# Altium schematic symbol library jlcpcb_2025_04_capacitors_extended_1206.schlib: 2503 symbols (part 14 of 14) (continued)
## TCC1206X7R334K500DT
designator C?  Capacitance: 330nF  (hidden comment: *)
Capacitor, Ceramic (MLCC), 330nF, ±10%, 50V, X7R, ±10%, SMD 1206; Manufacturer: CCTC; Manufacturer Part Number: TCC1206X7R334K500DT; Package Size: 1206; JLCPCB Basic Part: No; JLCPCB Part Number: C282862; Supplier 1: LCSC; Category: Capacitors - MLCC; Supplier Part Number 1: C282862; Tolerance: ±10%; Voltage Rating: 50V; Temperature Coefficient: X7R; RoHS: Yes; ComponentLink1Description: Datasheet; ComponentLink1URL: https://wmsc.lcsc.com/wmsc/upload/file/pdf/v2/lcsc/2304140030_CCTC-TCC1206X7R334K500DT_C282862.pdf; ComponentLink2Description: JLCPCB Part URL; ComponentLink2URL: https://jlcpcb.com/partdetail/C282862; ComponentLink3Description: LCSC Part URL; ComponentLink3URL: https://lcsc.com/product-detail/Multilayer-Ceramic-Capacitors-MLCC---SMD-SMT_CCTC-CCTC-TCC1206X7R334K500DT_C282862.html
footprint CAP-1206 (1206 (3216M) Capacitor)
pins: 1, 2

## TCC1206X7R335K250FT
designator C?  Capacitance: 3.3uF  (hidden comment: *)
Capacitor, Ceramic (MLCC), 3.3uF, ±10%, 25V, X7R, ±10%, SMD 1206; Manufacturer: CCTC; Manufacturer Part Number: TCC1206X7R335K250FT; Package Size: 1206; JLCPCB Basic Part: No; JLCPCB Part Number: C394259; Supplier 1: LCSC; Category: Capacitors - MLCC; Supplier Part Number 1: C394259; Tolerance: ±10%; Voltage Rating: 25V; Temperature Coefficient: X7R; RoHS: Yes; ComponentLink1Description: Datasheet; ComponentLink1URL: https://wmsc.lcsc.com/wmsc/upload/file/pdf/v2/lcsc/2304140030_CCTC-TCC1206X7R335K250FT_C394259.pdf; ComponentLink2Description: JLCPCB Part URL; ComponentLink2URL: https://jlcpcb.com/partdetail/C394259; ComponentLink3Description: LCSC Part URL; ComponentLink3URL: https://lcsc.com/product-detail/Multilayer-Ceramic-Capacitors-MLCC---SMD-SMT_CCTC-CCTC-TCC1206X7R335K250FT_C394259.html
footprint CAP-1206 (1206 (3216M) Capacitor)
pins: 1, 2

## TCC1206X7R391K102DTS
designator C?  Capacitance: 390pF  (hidden comment: *)
Capacitor, Ceramic (MLCC), 390pF, ±10%, 1kV, X7R, ±10%, SMD 1206; Manufacturer: CCTC; Manufacturer Part Number: TCC1206X7R391K102DTS; Package Size: 1206; JLCPCB Basic Part: No; JLCPCB Part Number: C696869; Supplier 1: LCSC; Category: Capacitors - MLCC; Supplier Part Number 1: C696869; Tolerance: ±10%; Voltage Rating: 1kV; Temperature Coefficient: X7R; RoHS: Yes; ComponentLink1Description: Datasheet; ComponentLink1URL: https://wmsc.lcsc.com/wmsc/upload/file/pdf/v2/lcsc/2304140030_CCTC-TCC1206X7R391K102DTS_C696869.pdf; ComponentLink2Description: JLCPCB Part URL; ComponentLink2URL: https://jlcpcb.com/partdetail/C696869; ComponentLink3Description: LCSC Part URL; ComponentLink3URL: https://lcsc.com/product-detail/Multilayer-Ceramic-Capacitors-MLCC---SMD-SMT_CCTC-CCTC-TCC1206X7R391K102DTS_C696869.html
footprint CAP-1206 (1206 (3216M) Capacitor)
pins: 1, 2

## TCC1206X7R391K500DT
designator C?  Capacitance: 390pF  (hidden comment: *)
Capacitor, Ceramic (MLCC), 390pF, ±10%, 50V, X7R, ±10%, SMD 1206; Manufacturer: CCTC; Manufacturer Part Number: TCC1206X7R391K500DT; Package Size: 1206; JLCPCB Basic Part: No; JLCPCB Part Number: C377097; Supplier 1: LCSC; Category: Capacitors - MLCC; Supplier Part Number 1: C377097; Tolerance: ±10%; Voltage Rating: 50V; Temperature Coefficient: X7R; RoHS: Yes; ComponentLink1Description: Datasheet; ComponentLink1URL: https://wmsc.lcsc.com/wmsc/upload/file/pdf/v2/lcsc/2304140030_CCTC-TCC1206X7R391K500DT_C377097.pdf; ComponentLink2Description: JLCPCB Part URL; ComponentLink2URL: https://jlcpcb.com/partdetail/C377097; ComponentLink3Description: LCSC Part URL; ComponentLink3URL: https://lcsc.com/product-detail/Multilayer-Ceramic-Capacitors-MLCC---SMD-SMT_CCTC-CCTC-TCC1206X7R391K500DT_C377097.html
footprint CAP-1206 (1206 (3216M) Capacitor)
pins: 1, 2

## TCC1206X7R392K102FT
designator C?  Capacitance: 3.9nF  (hidden comment: *)
Capacitor, Ceramic (MLCC), 3.9nF, ±10%, 1kV, X7R, ±10%, SMD 1206; Manufacturer: CCTC; Manufacturer Part Number: TCC1206X7R392K102FT; Package Size: 1206; JLCPCB Basic Part: No; JLCPCB Part Number: C7393995; Supplier 1: LCSC; Category: Capacitors - MLCC; Supplier Part Number 1: C7393995; Tolerance: ±10%; Voltage Rating: 1kV; Temperature Coefficient: X7R; RoHS: Yes; ComponentLink1Description: Datasheet; ComponentLink1URL: https://wmsc.lcsc.com/wmsc/upload/file/pdf/v2/lcsc/2306211528_CCTC-TCC1206X7R392K102FT_C7393995.pdf; ComponentLink2Description: JLCPCB Part URL; ComponentLink2URL: https://jlcpcb.com/partdetail/C7393995; ComponentLink3Description: LCSC Part URL; ComponentLink3URL: https://lcsc.com/product-detail/Multilayer-Ceramic-Capacitors-MLCC---SMD-SMT_CCTC-CCTC-TCC1206X7R392K102FT_C7393995.html
footprint CAP-1206 (1206 (3216M) Capacitor)
pins: 1, 2

## TCC1206X7R392K500DT
designator C?  Capacitance: 3.9nF  (hidden comment: *)
Capacitor, Ceramic (MLCC), 3.9nF, ±10%, 50V, X7R, ±10%, SMD 1206; Manufacturer: CCTC; Manufacturer Part Number: TCC1206X7R392K500DT; Package Size: 1206; JLCPCB Basic Part: No; JLCPCB Part Number: C696867; Supplier 1: LCSC; Category: Capacitors - MLCC; Supplier Part Number 1: C696867; Tolerance: ±10%; Voltage Rating: 50V; Temperature Coefficient: X7R; RoHS: Yes; ComponentLink1Description: Datasheet; ComponentLink1URL: https://wmsc.lcsc.com/wmsc/upload/file/pdf/v2/lcsc/2304140030_CCTC-TCC1206X7R392K500DT_C696867.pdf; ComponentLink2Description: JLCPCB Part URL; ComponentLink2URL: https://jlcpcb.com/partdetail/C696867; ComponentLink3Description: LCSC Part URL; ComponentLink3URL: https://lcsc.com/product-detail/Multilayer-Ceramic-Capacitors-MLCC---SMD-SMT_CCTC-CCTC-TCC1206X7R392K500DT_C696867.html
footprint CAP-1206 (1206 (3216M) Capacitor)
pins: 1, 2

## TCC1206X7R393K500DT
designator C?  Capacitance: 39nF  (hidden comment: *)
Capacitor, Ceramic (MLCC), 39nF, ±10%, 50V, X7R, ±10%, SMD 1206; Manufacturer: CCTC; Manufacturer Part Number: TCC1206X7R393K500DT; Package Size: 1206; JLCPCB Basic Part: No; JLCPCB Part Number: C282863; Supplier 1: LCSC; Category: Capacitors - MLCC; Supplier Part Number 1: C282863; Tolerance: ±10%; Voltage Rating: 50V; Temperature Coefficient: X7R; RoHS: Yes; ComponentLink1Description: Datasheet; ComponentLink1URL: https://wmsc.lcsc.com/wmsc/upload/file/pdf/v2/lcsc/2304140030_CCTC-TCC1206X7R393K500DT_C282863.pdf; ComponentLink2Description: JLCPCB Part URL; ComponentLink2URL: https://jlcpcb.com/partdetail/C282863; ComponentLink3Description: LCSC Part URL; ComponentLink3URL: https://lcsc.com/product-detail/Multilayer-Ceramic-Capacitors-MLCC---SMD-SMT_CCTC-CCTC-TCC1206X7R393K500DT_C282863.html
footprint CAP-1206 (1206 (3216M) Capacitor)
pins: 1, 2

## TCC1206X7R471K102DTS
designator C?  Capacitance: 470pF  (hidden comment: *)
Capacitor, Ceramic (MLCC), 470pF, ±10%, 1kV, X7R, ±10%, SMD 1206; Manufacturer: CCTC; Manufacturer Part Number: TCC1206X7R471K102DTS; Package Size: 1206; JLCPCB Basic Part: No; JLCPCB Part Number: C377098; Supplier 1: LCSC; Category: Capacitors - MLCC; Supplier Part Number 1: C377098; Tolerance: ±10%; Voltage Rating: 1kV; Temperature Coefficient: X7R; RoHS: Yes; ComponentLink1Description: Datasheet; ComponentLink1URL: https://wmsc.lcsc.com/wmsc/upload/file/pdf/v2/lcsc/2304140030_CCTC-TCC1206X7R471K102DTS_C377098.pdf; ComponentLink2Description: JLCPCB Part URL; ComponentLink2URL: https://jlcpcb.com/partdetail/C377098; ComponentLink3Description: LCSC Part URL; ComponentLink3URL: https://lcsc.com/product-detail/Multilayer-Ceramic-Capacitors-MLCC---SMD-SMT_CCTC-CCTC-TCC1206X7R471K102DTS_C377098.html
footprint CAP-1206 (1206 (3216M) Capacitor)
pins: 1, 2

## TCC1206X7R471K102FT
designator C?  Capacitance: 470pF  (hidden comment: *)
Capacitor, Ceramic (MLCC), 470pF, ±10%, 1kV, X7R, ±10%, SMD 1206; Manufacturer: CCTC; Manufacturer Part Number: TCC1206X7R471K102FT; Package Size: 1206; JLCPCB Basic Part: No; JLCPCB Part Number: C282864; Supplier 1: LCSC; Category: Capacitors - MLCC; Supplier Part Number 1: C282864; Tolerance: ±10%; Voltage Rating: 1kV; Temperature Coefficient: X7R; RoHS: Yes; ComponentLink1Description: Datasheet; ComponentLink1URL: https://wmsc.lcsc.com/wmsc/upload/file/pdf/v2/lcsc/2304140030_CCTC-TCC1206X7R471K102FT_C282864.pdf; ComponentLink2Description: JLCPCB Part URL; ComponentLink2URL: https://jlcpcb.com/partdetail/C282864; ComponentLink3Description: LCSC Part URL; ComponentLink3URL: https://lcsc.com/product-detail/Multilayer-Ceramic-Capacitors-MLCC---SMD-SMT_CCTC-CCTC-TCC1206X7R471K102FT_C282864.html
footprint CAP-1206 (1206 (3216M) Capacitor)
pins: 1, 2

## TCC1206X7R471K202FT
designator C?  Capacitance: 470pF  (hidden comment: *)
Capacitor, Ceramic (MLCC), 470pF, ±10%, 2kV, X7R, ±10%, SMD 1206; Manufacturer: CCTC; Manufacturer Part Number: TCC1206X7R471K202FT; Package Size: 1206; JLCPCB Basic Part: No; JLCPCB Part Number: C359188; Supplier 1: LCSC; Category: Capacitors - MLCC; Supplier Part Number 1: C359188; Tolerance: ±10%; Voltage Rating: 2kV; Temperature Coefficient: X7R; RoHS: Yes; ComponentLink1Description: Datasheet; ComponentLink1URL: https://wmsc.lcsc.com/wmsc/upload/file/pdf/v2/lcsc/2304140030_CCTC-TCC1206X7R471K202FT_C359188.pdf; ComponentLink2Description: JLCPCB Part URL; ComponentLink2URL: https://jlcpcb.com/partdetail/C359188; ComponentLink3Description: LCSC Part URL; ComponentLink3URL: https://lcsc.com/product-detail/Multilayer-Ceramic-Capacitors-MLCC---SMD-SMT_CCTC-CCTC-TCC1206X7R471K202FT_C359188.html
footprint CAP-1206 (1206 (3216M) Capacitor)
pins: 1, 2

## TCC1206X7R471K251DT
designator C?  Capacitance: 470pF  (hidden comment: *)
Capacitor, Ceramic (MLCC), 470pF, ±10%, 250V, X7R, ±10%, SMD 1206; Manufacturer: CCTC; Manufacturer Part Number: TCC1206X7R471K251DT; Package Size: 1206; JLCPCB Basic Part: No; JLCPCB Part Number: C377099; Supplier 1: LCSC; Category: Capacitors - MLCC; Supplier Part Number 1: C377099; Tolerance: ±10%; Voltage Rating: 250V; Temperature Coefficient: X7R; RoHS: Yes; ComponentLink1Description: Datasheet; ComponentLink1URL: https://wmsc.lcsc.com/wmsc/upload/file/pdf/v2/lcsc/2304140030_CCTC-TCC1206X7R471K251DT_C377099.pdf; ComponentLink2Description: JLCPCB Part URL; ComponentLink2URL: https://jlcpcb.com/partdetail/C377099; ComponentLink3Description: LCSC Part URL; ComponentLink3URL: https://lcsc.com/product-detail/Multilayer-Ceramic-Capacitors-MLCC---SMD-SMT_CCTC-CCTC-TCC1206X7R471K251DT_C377099.html
footprint CAP-1206 (1206 (3216M) Capacitor)
pins: 1, 2

## TCC1206X7R471K500DT
designator C?  Capacitance: 470pF  (hidden comment: *)
Capacitor, Ceramic (MLCC), 470pF, ±10%, 50V, X7R, ±10%, SMD 1206; Manufacturer: CCTC; Manufacturer Part Number: TCC1206X7R471K500DT; Package Size: 1206; JLCPCB Basic Part: No; JLCPCB Part Number: C309043; Supplier 1: LCSC; Category: Capacitors - MLCC; Supplier Part Number 1: C309043; Tolerance: ±10%; Voltage Rating: 50V; Temperature Coefficient: X7R; RoHS: Yes; ComponentLink1Description: Datasheet; ComponentLink1URL: https://wmsc.lcsc.com/wmsc/upload/file/pdf/v2/lcsc/2304140030_CCTC-TCC1206X7R471K500DT_C309043.pdf; ComponentLink2Description: JLCPCB Part URL; ComponentLink2URL: https://jlcpcb.com/partdetail/C309043; ComponentLink3Description: LCSC Part URL; ComponentLink3URL: https://lcsc.com/product-detail/Multilayer-Ceramic-Capacitors-MLCC---SMD-SMT_CCTC-CCTC-TCC1206X7R471K500DT_C309043.html
footprint CAP-1206 (1206 (3216M) Capacitor)
pins: 1, 2

## TCC1206X7R471K501DT
designator C?  Capacitance: 470pF  (hidden comment: *)
Capacitor, Ceramic (MLCC), 470pF, ±10%, 500V, X7R, ±10%, SMD 1206; Manufacturer: CCTC; Manufacturer Part Number: TCC1206X7R471K501DT; Package Size: 1206; JLCPCB Basic Part: No; JLCPCB Part Number: C309042; Supplier 1: LCSC; Category: Capacitors - MLCC; Supplier Part Number 1: C309042; Tolerance: ±10%; Voltage Rating: 500V; Temperature Coefficient: X7R; RoHS: Yes; ComponentLink1Description: Datasheet; ComponentLink1URL: https://wmsc.lcsc.com/wmsc/upload/file/pdf/v2/lcsc/2304140030_CCTC-TCC1206X7R471K501DT_C309042.pdf; ComponentLink2Description: JLCPCB Part URL; ComponentLink2URL: https://jlcpcb.com/partdetail/C309042; ComponentLink3Description: LCSC Part URL; ComponentLink3URL: https://lcsc.com/product-detail/Multilayer-Ceramic-Capacitors-MLCC---SMD-SMT_CCTC-CCTC-TCC1206X7R471K501DT_C309042.html
footprint CAP-1206 (1206 (3216M) Capacitor)
pins: 1, 2

## TCC1206X7R472K102FT
designator C?  Capacitance: 4.7nF  (hidden comment: *)
Capacitor, Ceramic (MLCC), 4.7nF, ±10%, 1kV, X7R, ±10%, SMD 1206; Manufacturer: CCTC; Manufacturer Part Number: TCC1206X7R472K102FT; Package Size: 1206; JLCPCB Basic Part: No; JLCPCB Part Number: C377102; Supplier 1: LCSC; Category: Capacitors - MLCC; Supplier Part Number 1: C377102; Tolerance: ±10%; Voltage Rating: 1kV; Temperature Coefficient: X7R; RoHS: Yes; ComponentLink1Description: Datasheet; ComponentLink1URL: https://wmsc.lcsc.com/wmsc/upload/file/pdf/v2/lcsc/2304140030_CCTC-TCC1206X7R472K102FT_C377102.pdf; ComponentLink2Description: JLCPCB Part URL; ComponentLink2URL: https://jlcpcb.com/partdetail/C377102; ComponentLink3Description: LCSC Part URL; ComponentLink3URL: https://lcsc.com/product-detail/Multilayer-Ceramic-Capacitors-MLCC---SMD-SMT_CCTC-CCTC-TCC1206X7R472K102FT_C377102.html
footprint CAP-1206 (1206 (3216M) Capacitor)
pins: 1, 2

## TCC1206X7R472K251DT
designator C?  Capacitance: 4.7nF  (hidden comment: *)
Capacitor, Ceramic (MLCC), 4.7nF, ±10%, 250V, X7R, ±10%, SMD 1206; Manufacturer: CCTC; Manufacturer Part Number: TCC1206X7R472K251DT; Package Size: 1206; JLCPCB Basic Part: No; JLCPCB Part Number: C377103; Supplier 1: LCSC; Category: Capacitors - MLCC; Supplier Part Number 1: C377103; Tolerance: ±10%; Voltage Rating: 250V; Temperature Coefficient: X7R; RoHS: Yes; ComponentLink1Description: Datasheet; ComponentLink1URL: https://wmsc.lcsc.com/wmsc/upload/file/pdf/v2/lcsc/2304140030_CCTC-TCC1206X7R472K251DT_C377103.pdf; ComponentLink2Description: JLCPCB Part URL; ComponentLink2URL: https://jlcpcb.com/partdetail/C377103; ComponentLink3Description: LCSC Part URL; ComponentLink3URL: https://lcsc.com/product-detail/Multilayer-Ceramic-Capacitors-MLCC---SMD-SMT_CCTC-CCTC-TCC1206X7R472K251DT_C377103.html
footprint CAP-1206 (1206 (3216M) Capacitor)
pins: 1, 2

## TCC1206X7R472K500DT
designator C?  Capacitance: 4.7nF  (hidden comment: *)
Capacitor, Ceramic (MLCC), 4.7nF, ±10%, 50V, X7R, ±10%, SMD 1206; Manufacturer: CCTC; Manufacturer Part Number: TCC1206X7R472K500DT; Package Size: 1206; JLCPCB Basic Part: No; JLCPCB Part Number: C282865; Supplier 1: LCSC; Category: Capacitors - MLCC; Supplier Part Number 1: C282865; Tolerance: ±10%; Voltage Rating: 50V; Temperature Coefficient: X7R; RoHS: Yes; ComponentLink1Description: Datasheet; ComponentLink1URL: https://wmsc.lcsc.com/wmsc/upload/file/pdf/v2/lcsc/2304140030_CCTC-TCC1206X7R472K500DT_C282865.pdf; ComponentLink2Description: JLCPCB Part URL; ComponentLink2URL: https://jlcpcb.com/partdetail/C282865; ComponentLink3Description: LCSC Part URL; ComponentLink3URL: https://lcsc.com/product-detail/Multilayer-Ceramic-Capacitors-MLCC---SMD-SMT_CCTC-CCTC-TCC1206X7R472K500DT_C282865.html
footprint CAP-1206 (1206 (3216M) Capacitor)
pins: 1, 2

## TCC1206X7R472K501DT
designator C?  Capacitance: 4.7nF  (hidden comment: *)
Capacitor, Ceramic (MLCC), 4.7nF, ±10%, 500V, X7R, ±10%, SMD 1206; Manufacturer: CCTC; Manufacturer Part Number: TCC1206X7R472K501DT; Package Size: 1206; JLCPCB Basic Part: No; JLCPCB Part Number: C282866; Supplier 1: LCSC; Category: Capacitors - MLCC; Supplier Part Number 1: C282866; Tolerance: ±10%; Voltage Rating: 500V; Temperature Coefficient: X7R; RoHS: Yes; ComponentLink1Description: Datasheet; ComponentLink1URL: https://wmsc.lcsc.com/wmsc/upload/file/pdf/v2/lcsc/2304140030_CCTC-TCC1206X7R472K501DT_C282866.pdf; ComponentLink2Description: JLCPCB Part URL; ComponentLink2URL: https://jlcpcb.com/partdetail/C282866; ComponentLink3Description: LCSC Part URL; ComponentLink3URL: https://lcsc.com/product-detail/Multilayer-Ceramic-Capacitors-MLCC---SMD-SMT_CCTC-CCTC-TCC1206X7R472K501DT_C282866.html
footprint CAP-1206 (1206 (3216M) Capacitor)
pins: 1, 2

## TCC1206X7R473K101DT
designator C?  Capacitance: 47nF  (hidden comment: *)
Capacitor, Ceramic (MLCC), 47nF, ±10%, 100V, X7R, ±10%, SMD 1206; Manufacturer: CCTC; Manufacturer Part Number: TCC1206X7R473K101DT; Package Size: 1206; JLCPCB Basic Part: No; JLCPCB Part Number: C282867; Supplier 1: LCSC; Category: Capacitors - MLCC; Supplier Part Number 1: C282867; Tolerance: ±10%; Voltage Rating: 100V; Temperature Coefficient: X7R; RoHS: Yes; ComponentLink1Description: Datasheet; ComponentLink1URL: https://wmsc.lcsc.com/wmsc/upload/file/pdf/v2/lcsc/2304140030_CCTC-TCC1206X7R473K101DT_C282867.pdf; ComponentLink2Description: JLCPCB Part URL; ComponentLink2URL: https://jlcpcb.com/partdetail/C282867; ComponentLink3Description: LCSC Part URL; ComponentLink3URL: https://lcsc.com/product-detail/Multilayer-Ceramic-Capacitors-MLCC---SMD-SMT_CCTC-CCTC-TCC1206X7R473K101DT_C282867.html
footprint CAP-1206 (1206 (3216M) Capacitor)
pins: 1, 2

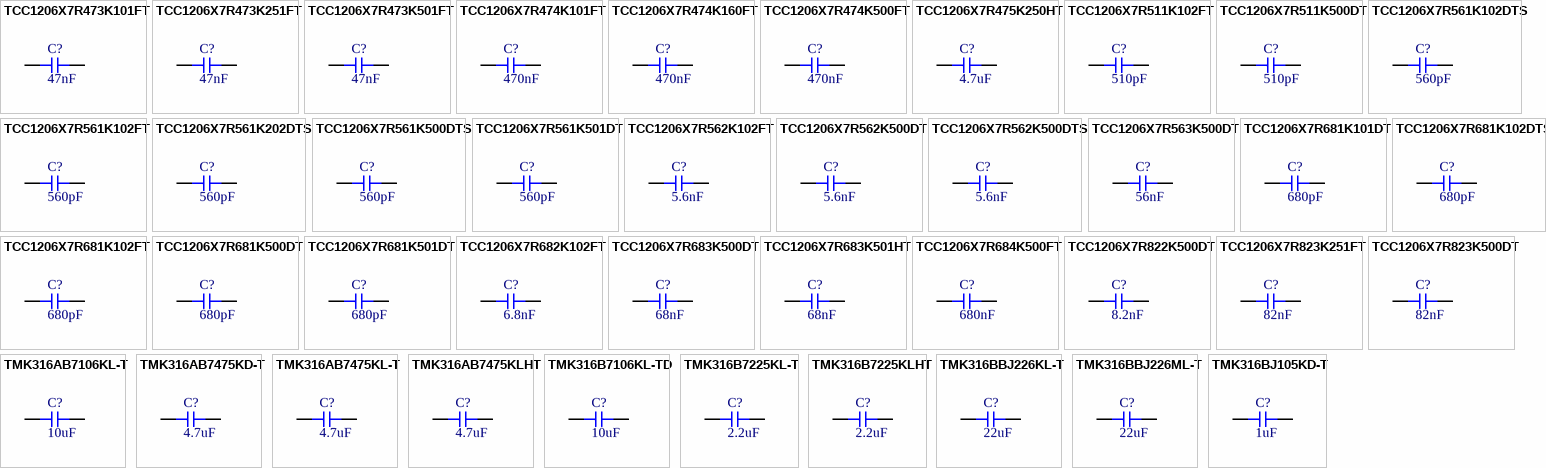
[diagram p61: symbols TCC1206X7R473K101FT to TMK316BJ105KD-T]

## TCC1206X7R473K101FT
designator C?  Capacitance: 47nF  (hidden comment: *)
Capacitor, Ceramic (MLCC), 47nF, ±10%, 100V, X7R, ±10%, SMD 1206; Manufacturer: CCTC; Manufacturer Part Number: TCC1206X7R473K101FT; Package Size: 1206; JLCPCB Basic Part: No; JLCPCB Part Number: C282868; Supplier 1: LCSC; Category: Capacitors - MLCC; Supplier Part Number 1: C282868; Tolerance: ±10%; Voltage Rating: 100V; Temperature Coefficient: X7R; RoHS: Yes; ComponentLink1Description: Datasheet; ComponentLink1URL: https://wmsc.lcsc.com/wmsc/upload/file/pdf/v2/lcsc/2304140030_CCTC-TCC1206X7R473K101FT_C282868.pdf; ComponentLink2Description: JLCPCB Part URL; ComponentLink2URL: https://jlcpcb.com/partdetail/C282868; ComponentLink3Description: LCSC Part URL; ComponentLink3URL: https://lcsc.com/product-detail/Multilayer-Ceramic-Capacitors-MLCC---SMD-SMT_CCTC-CCTC-TCC1206X7R473K101FT_C282868.html
footprint CAP-1206 (1206 (3216M) Capacitor)
pins: 1, 2

## TCC1206X7R473K251FT
designator C?  Capacitance: 47nF  (hidden comment: *)
Capacitor, Ceramic (MLCC), 47nF, ±10%, 250V, X7R, ±10%, SMD 1206; Manufacturer: CCTC; Manufacturer Part Number: TCC1206X7R473K251FT; Package Size: 1206; JLCPCB Basic Part: No; JLCPCB Part Number: C282869; Supplier 1: LCSC; Category: Capacitors - MLCC; Supplier Part Number 1: C282869; Tolerance: ±10%; Voltage Rating: 250V; Temperature Coefficient: X7R; RoHS: Yes; ComponentLink1Description: Datasheet; ComponentLink1URL: https://wmsc.lcsc.com/wmsc/upload/file/pdf/v2/lcsc/2304140030_CCTC-TCC1206X7R473K251FT_C282869.pdf; ComponentLink2Description: JLCPCB Part URL; ComponentLink2URL: https://jlcpcb.com/partdetail/C282869; ComponentLink3Description: LCSC Part URL; ComponentLink3URL: https://lcsc.com/product-detail/Multilayer-Ceramic-Capacitors-MLCC---SMD-SMT_CCTC-CCTC-TCC1206X7R473K251FT_C282869.html
footprint CAP-1206 (1206 (3216M) Capacitor)
pins: 1, 2

## TCC1206X7R473K501FT
designator C?  Capacitance: 47nF  (hidden comment: *)
Capacitor, Ceramic (MLCC), 47nF, ±10%, 500V, X7R, ±10%, SMD 1206; Manufacturer: CCTC; Manufacturer Part Number: TCC1206X7R473K501FT; Package Size: 1206; JLCPCB Basic Part: No; JLCPCB Part Number: C309031; Supplier 1: LCSC; Category: Capacitors - MLCC; Supplier Part Number 1: C309031; Tolerance: ±10%; Voltage Rating: 500V; Temperature Coefficient: X7R; RoHS: Yes; ComponentLink1Description: Datasheet; ComponentLink1URL: https://wmsc.lcsc.com/wmsc/upload/file/pdf/v2/lcsc/2304140030_CCTC-TCC1206X7R473K501FT_C309031.pdf; ComponentLink2Description: JLCPCB Part URL; ComponentLink2URL: https://jlcpcb.com/partdetail/C309031; ComponentLink3Description: LCSC Part URL; ComponentLink3URL: https://lcsc.com/product-detail/Multilayer-Ceramic-Capacitors-MLCC---SMD-SMT_CCTC-CCTC-TCC1206X7R473K501FT_C309031.html
footprint CAP-1206 (1206 (3216M) Capacitor)
pins: 1, 2

## TCC1206X7R474K101FT
designator C?  Capacitance: 470nF  (hidden comment: *)
Capacitor, Ceramic (MLCC), 470nF, ±10%, 100V, X7R, ±10%, SMD 1206; Manufacturer: CCTC; Manufacturer Part Number: TCC1206X7R474K101FT; Package Size: 1206; JLCPCB Basic Part: No; JLCPCB Part Number: C282871; Supplier 1: LCSC; Category: Capacitors - MLCC; Supplier Part Number 1: C282871; Tolerance: ±10%; Voltage Rating: 100V; Temperature Coefficient: X7R; RoHS: Yes; ComponentLink1Description: Datasheet; ComponentLink1URL: https://wmsc.lcsc.com/wmsc/upload/file/pdf/v2/lcsc/2304140030_CCTC-TCC1206X7R474K101FT_C282871.pdf; ComponentLink2Description: JLCPCB Part URL; ComponentLink2URL: https://jlcpcb.com/partdetail/C282871; ComponentLink3Description: LCSC Part URL; ComponentLink3URL: https://lcsc.com/product-detail/Multilayer-Ceramic-Capacitors-MLCC---SMD-SMT_CCTC-CCTC-TCC1206X7R474K101FT_C282871.html
footprint CAP-1206 (1206 (3216M) Capacitor)
pins: 1, 2

## TCC1206X7R474K160FT
designator C?  Capacitance: 470nF  (hidden comment: *)
Capacitor, Ceramic (MLCC), 470nF, ±10%, 16V, X7R, ±10%, SMD 1206; Manufacturer: CCTC; Manufacturer Part Number: TCC1206X7R474K160FT; Package Size: 1206; JLCPCB Basic Part: No; JLCPCB Part Number: C377106; Supplier 1: LCSC; Category: Capacitors - MLCC; Supplier Part Number 1: C377106; Tolerance: ±10%; Voltage Rating: 16V; Temperature Coefficient: X7R; RoHS: Yes; ComponentLink1Description: Datasheet; ComponentLink1URL: https://wmsc.lcsc.com/wmsc/upload/file/pdf/v2/lcsc/2304140030_CCTC-TCC1206X7R474K160FT_C377106.pdf; ComponentLink2Description: JLCPCB Part URL; ComponentLink2URL: https://jlcpcb.com/partdetail/C377106; ComponentLink3Description: LCSC Part URL; ComponentLink3URL: https://lcsc.com/product-detail/Multilayer-Ceramic-Capacitors-MLCC---SMD-SMT_CCTC-CCTC-TCC1206X7R474K160FT_C377106.html
footprint CAP-1206 (1206 (3216M) Capacitor)
pins: 1, 2

## TCC1206X7R474K500FT
designator C?  Capacitance: 470nF  (hidden comment: *)
Capacitor, Ceramic (MLCC), 470nF, ±10%, 50V, X7R, ±10%, SMD 1206; Manufacturer: CCTC; Manufacturer Part Number: TCC1206X7R474K500FT; Package Size: 1206; JLCPCB Basic Part: No; JLCPCB Part Number: C282872; Supplier 1: LCSC; Category: Capacitors - MLCC; Supplier Part Number 1: C282872; Tolerance: ±10%; Voltage Rating: 50V; Temperature Coefficient: X7R; RoHS: Yes; ComponentLink1Description: Datasheet; ComponentLink1URL: https://wmsc.lcsc.com/wmsc/upload/file/pdf/v2/lcsc/2304140030_CCTC-TCC1206X7R474K500FT_C282872.pdf; ComponentLink2Description: JLCPCB Part URL; ComponentLink2URL: https://jlcpcb.com/partdetail/C282872; ComponentLink3Description: LCSC Part URL; ComponentLink3URL: https://lcsc.com/product-detail/Multilayer-Ceramic-Capacitors-MLCC---SMD-SMT_CCTC-CCTC-TCC1206X7R474K500FT_C282872.html
footprint CAP-1206 (1206 (3216M) Capacitor)
pins: 1, 2

## TCC1206X7R475K250HT
designator C?  Capacitance: 4.7uF  (hidden comment: *)
Capacitor, Ceramic (MLCC), 4.7uF, ±10%, 25V, X7R, ±10%, SMD 1206; Manufacturer: CCTC; Manufacturer Part Number: TCC1206X7R475K250HT; Package Size: 1206; JLCPCB Basic Part: No; JLCPCB Part Number: C380365; Supplier 1: LCSC; Category: Capacitors - MLCC; Supplier Part Number 1: C380365; Tolerance: ±10%; Voltage Rating: 25V; Temperature Coefficient: X7R; RoHS: Yes; ComponentLink1Description: Datasheet; ComponentLink1URL: https://wmsc.lcsc.com/wmsc/upload/file/pdf/v2/lcsc/2304140030_CCTC-TCC1206X7R475K250HT_C380365.pdf; ComponentLink2Description: JLCPCB Part URL; ComponentLink2URL: https://jlcpcb.com/partdetail/C380365; ComponentLink3Description: LCSC Part URL; ComponentLink3URL: https://lcsc.com/product-detail/Multilayer-Ceramic-Capacitors-MLCC---SMD-SMT_CCTC-CCTC-TCC1206X7R475K250HT_C380365.html
footprint CAP-1206 (1206 (3216M) Capacitor)
pins: 1, 2

## TCC1206X7R511K102FT
designator C?  Capacitance: 510pF  (hidden comment: *)
Capacitor, Ceramic (MLCC), 510pF, ±10%, 1kV, X7R, ±10%, SMD 1206; Manufacturer: CCTC; Manufacturer Part Number: TCC1206X7R511K102FT; Package Size: 1206; JLCPCB Basic Part: No; JLCPCB Part Number: C5449049; Supplier 1: LCSC; Category: Capacitors - MLCC; Supplier Part Number 1: C5449049; Tolerance: ±10%; Voltage Rating: 1kV; Temperature Coefficient: X7R; RoHS: Yes; ComponentLink1Description: Datasheet; ComponentLink2Description: JLCPCB Part URL; ComponentLink2URL: https://jlcpcb.com/partdetail/C5449049; ComponentLink3Description: LCSC Part URL; ComponentLink3URL: https://lcsc.com/product-detail/Multilayer-Ceramic-Capacitors-MLCC---SMD-SMT_CCTC-CCTC-TCC1206X7R511K102FT_C5449049.html
footprint CAP-1206 (1206 (3216M) Capacitor)
pins: 1, 2

## TCC1206X7R511K500DT
designator C?  Capacitance: 510pF  (hidden comment: *)
Capacitor, Ceramic (MLCC), 510pF, ±10%, 50V, X7R, ±10%, SMD 1206; Manufacturer: CCTC; Manufacturer Part Number: TCC1206X7R511K500DT; Package Size: 1206; JLCPCB Basic Part: No; JLCPCB Part Number: C377108; Supplier 1: LCSC; Category: Capacitors - MLCC; Supplier Part Number 1: C377108; Tolerance: ±10%; Voltage Rating: 50V; Temperature Coefficient: X7R; RoHS: Yes; ComponentLink1Description: Datasheet; ComponentLink1URL: https://wmsc.lcsc.com/wmsc/upload/file/pdf/v2/lcsc/2304140030_CCTC-TCC1206X7R511K500DT_C377108.pdf; ComponentLink2Description: JLCPCB Part URL; ComponentLink2URL: https://jlcpcb.com/partdetail/C377108; ComponentLink3Description: LCSC Part URL; ComponentLink3URL: https://lcsc.com/product-detail/Multilayer-Ceramic-Capacitors-MLCC---SMD-SMT_CCTC-CCTC-TCC1206X7R511K500DT_C377108.html
footprint CAP-1206 (1206 (3216M) Capacitor)
pins: 1, 2

## TCC1206X7R561K102DTS
designator C?  Capacitance: 560pF  (hidden comment: *)
Capacitor, Ceramic (MLCC), 560pF, ±10%, 1kV, X7R, ±10%, SMD 1206; Manufacturer: CCTC; Manufacturer Part Number: TCC1206X7R561K102DTS; Package Size: 1206; JLCPCB Basic Part: No; JLCPCB Part Number: C880649; Supplier 1: LCSC; Category: Capacitors - MLCC; Supplier Part Number 1: C880649; Tolerance: ±10%; Voltage Rating: 1kV; Temperature Coefficient: X7R; RoHS: Yes; ComponentLink1Description: Datasheet; ComponentLink1URL: https://wmsc.lcsc.com/wmsc/upload/file/pdf/v2/lcsc/2304140030_CCTC-TCC1206X7R561K102DTS_C880649.pdf; ComponentLink2Description: JLCPCB Part URL; ComponentLink2URL: https://jlcpcb.com/partdetail/C880649; ComponentLink3Description: LCSC Part URL; ComponentLink3URL: https://lcsc.com/product-detail/Multilayer-Ceramic-Capacitors-MLCC---SMD-SMT_CCTC-CCTC-TCC1206X7R561K102DTS_C880649.html
footprint CAP-1206 (1206 (3216M) Capacitor)
pins: 1, 2

## TCC1206X7R561K102FT
designator C?  Capacitance: 560pF  (hidden comment: *)
Capacitor, Ceramic (MLCC), 560pF, ±10%, 1kV, X7R, ±10%, SMD 1206; Manufacturer: CCTC; Manufacturer Part Number: TCC1206X7R561K102FT; Package Size: 1206; JLCPCB Basic Part: No; JLCPCB Part Number: C282873; Supplier 1: LCSC; Category: Capacitors - MLCC; Supplier Part Number 1: C282873; Tolerance: ±10%; Voltage Rating: 1kV; Temperature Coefficient: X7R; RoHS: Yes; ComponentLink1Description: Datasheet; ComponentLink1URL: https://wmsc.lcsc.com/wmsc/upload/file/pdf/v2/lcsc/2304140030_CCTC-TCC1206X7R561K102FT_C282873.pdf; ComponentLink2Description: JLCPCB Part URL; ComponentLink2URL: https://jlcpcb.com/partdetail/C282873; ComponentLink3Description: LCSC Part URL; ComponentLink3URL: https://lcsc.com/product-detail/Multilayer-Ceramic-Capacitors-MLCC---SMD-SMT_CCTC-CCTC-TCC1206X7R561K102FT_C282873.html
footprint CAP-1206 (1206 (3216M) Capacitor)
pins: 1, 2

## TCC1206X7R561K202DTS
designator C?  Capacitance: 560pF  (hidden comment: *)
Capacitor, Ceramic (MLCC), 560pF, ±10%, 2kV, X7R, ±10%, SMD 1206; Manufacturer: CCTC; Manufacturer Part Number: TCC1206X7R561K202DTS; Package Size: 1206; JLCPCB Basic Part: No; JLCPCB Part Number: C2760550; Supplier 1: LCSC; Category: Capacitors - MLCC; Supplier Part Number 1: C2760550; Tolerance: ±10%; Voltage Rating: 2kV; Temperature Coefficient: X7R; RoHS: Yes; ComponentLink1Description: Datasheet; ComponentLink1URL: https://wmsc.lcsc.com/wmsc/upload/file/pdf/v2/lcsc/2103151812_CCTC-TCC1206X7R561K202DTS_C2760550.pdf; ComponentLink2Description: JLCPCB Part URL; ComponentLink2URL: https://jlcpcb.com/partdetail/C2760550; ComponentLink3Description: LCSC Part URL; ComponentLink3URL: https://lcsc.com/product-detail/Multilayer-Ceramic-Capacitors-MLCC---SMD-SMT_CCTC-CCTC-TCC1206X7R561K202DTS_C2760550.html
footprint CAP-1206 (1206 (3216M) Capacitor)
pins: 1, 2

## TCC1206X7R561K500DTS
designator C?  Capacitance: 560pF  (hidden comment: *)
Capacitor, Ceramic (MLCC), 560pF, ±10%, 50V, X7R, ±10%, SMD 1206; Manufacturer: CCTC; Manufacturer Part Number: TCC1206X7R561K500DTS; Package Size: 1206; JLCPCB Basic Part: No; JLCPCB Part Number: C282874; Supplier 1: LCSC; Category: Capacitors - MLCC; Supplier Part Number 1: C282874; Tolerance: ±10%; Voltage Rating: 50V; Temperature Coefficient: X7R; RoHS: Yes; ComponentLink1Description: Datasheet; ComponentLink1URL: https://wmsc.lcsc.com/wmsc/upload/file/pdf/v2/lcsc/2304140030_CCTC-TCC1206X7R561K500DTS_C282874.pdf; ComponentLink2Description: JLCPCB Part URL; ComponentLink2URL: https://jlcpcb.com/partdetail/C282874; ComponentLink3Description: LCSC Part URL; ComponentLink3URL: https://lcsc.com/product-detail/Multilayer-Ceramic-Capacitors-MLCC---SMD-SMT_CCTC-CCTC-TCC1206X7R561K500DTS_C282874.html
footprint CAP-1206 (1206 (3216M) Capacitor)
pins: 1, 2

## TCC1206X7R561K501DT
designator C?  Capacitance: 560pF  (hidden comment: *)
Capacitor, Ceramic (MLCC), 560pF, ±10%, 500V, X7R, ±10%, SMD 1206; Manufacturer: CCTC; Manufacturer Part Number: TCC1206X7R561K501DT; Package Size: 1206; JLCPCB Basic Part: No; JLCPCB Part Number: C377112; Supplier 1: LCSC; Category: Capacitors - MLCC; Supplier Part Number 1: C377112; Tolerance: ±10%; Voltage Rating: 500V; Temperature Coefficient: X7R; RoHS: Yes; ComponentLink1Description: Datasheet; ComponentLink1URL: https://wmsc.lcsc.com/wmsc/upload/file/pdf/v2/lcsc/2304140030_CCTC-TCC1206X7R561K501DT_C377112.pdf; ComponentLink2Description: JLCPCB Part URL; ComponentLink2URL: https://jlcpcb.com/partdetail/C377112; ComponentLink3Description: LCSC Part URL; ComponentLink3URL: https://lcsc.com/product-detail/Multilayer-Ceramic-Capacitors-MLCC---SMD-SMT_CCTC-CCTC-TCC1206X7R561K501DT_C377112.html
footprint CAP-1206 (1206 (3216M) Capacitor)
pins: 1, 2

## TCC1206X7R562K102FT
designator C?  Capacitance: 5.6nF  (hidden comment: *)
Capacitor, Ceramic (MLCC), 5.6nF, ±10%, 1kV, X7R, ±10%, SMD 1206; Manufacturer: CCTC; Manufacturer Part Number: TCC1206X7R562K102FT; Package Size: 1206; JLCPCB Basic Part: No; JLCPCB Part Number: C282875; Supplier 1: LCSC; Category: Capacitors - MLCC; Supplier Part Number 1: C282875; Tolerance: ±10%; Voltage Rating: 1kV; Temperature Coefficient: X7R; RoHS: Yes; ComponentLink1Description: Datasheet; ComponentLink1URL: https://wmsc.lcsc.com/wmsc/upload/file/pdf/v2/lcsc/2304140030_CCTC-TCC1206X7R562K102FT_C282875.pdf; ComponentLink2Description: JLCPCB Part URL; ComponentLink2URL: https://jlcpcb.com/partdetail/C282875; ComponentLink3Description: LCSC Part URL; ComponentLink3URL: https://lcsc.com/product-detail/Multilayer-Ceramic-Capacitors-MLCC---SMD-SMT_CCTC-CCTC-TCC1206X7R562K102FT_C282875.html
footprint CAP-1206 (1206 (3216M) Capacitor)
pins: 1, 2

## TCC1206X7R562K500DT
designator C?  Capacitance: 5.6nF  (hidden comment: *)
Capacitor, Ceramic (MLCC), 5.6nF, ±10%, 50V, X7R, ±10%, SMD 1206; Manufacturer: CCTC; Manufacturer Part Number: TCC1206X7R562K500DT; Package Size: 1206; JLCPCB Basic Part: No; JLCPCB Part Number: C282876; Supplier 1: LCSC; Category: Capacitors - MLCC; Supplier Part Number 1: C282876; Tolerance: ±10%; Voltage Rating: 50V; Temperature Coefficient: X7R; RoHS: Yes; ComponentLink1Description: Datasheet; ComponentLink1URL: https://wmsc.lcsc.com/wmsc/upload/file/pdf/v2/lcsc/2304140030_CCTC-TCC1206X7R562K500DT_C282876.pdf; ComponentLink2Description: JLCPCB Part URL; ComponentLink2URL: https://jlcpcb.com/partdetail/C282876; ComponentLink3Description: LCSC Part URL; ComponentLink3URL: https://lcsc.com/product-detail/Multilayer-Ceramic-Capacitors-MLCC---SMD-SMT_CCTC-CCTC-TCC1206X7R562K500DT_C282876.html
footprint CAP-1206 (1206 (3216M) Capacitor)
pins: 1, 2

## TCC1206X7R562K500DTS
designator C?  Capacitance: 5.6nF  (hidden comment: *)
Capacitor, Ceramic (MLCC), 5.6nF, ±10%, 50V, X7R, ±10%, SMD 1206; Manufacturer: CCTC; Manufacturer Part Number: TCC1206X7R562K500DTS; Package Size: 1206; JLCPCB Basic Part: No; JLCPCB Part Number: C282877; Supplier 1: LCSC; Category: Capacitors - MLCC; Supplier Part Number 1: C282877; Tolerance: ±10%; Voltage Rating: 50V; Temperature Coefficient: X7R; RoHS: Yes; ComponentLink1Description: Datasheet; ComponentLink1URL: https://wmsc.lcsc.com/wmsc/upload/file/pdf/v2/lcsc/2304140030_CCTC-TCC1206X7R562K500DTS_C282877.pdf; ComponentLink2Description: JLCPCB Part URL; ComponentLink2URL: https://jlcpcb.com/partdetail/C282877; ComponentLink3Description: LCSC Part URL; ComponentLink3URL: https://lcsc.com/product-detail/Multilayer-Ceramic-Capacitors-MLCC---SMD-SMT_CCTC-CCTC-TCC1206X7R562K500DTS_C282877.html
footprint CAP-1206 (1206 (3216M) Capacitor)
pins: 1, 2

## TCC1206X7R563K500DT
designator C?  Capacitance: 56nF  (hidden comment: *)
Capacitor, Ceramic (MLCC), 56nF, ±10%, 50V, X7R, ±10%, SMD 1206; Manufacturer: CCTC; Manufacturer Part Number: TCC1206X7R563K500DT; Package Size: 1206; JLCPCB Basic Part: No; JLCPCB Part Number: C282879; Supplier 1: LCSC; Category: Capacitors - MLCC; Supplier Part Number 1: C282879; Tolerance: ±10%; Voltage Rating: 50V; Temperature Coefficient: X7R; RoHS: Yes; ComponentLink1Description: Datasheet; ComponentLink1URL: https://wmsc.lcsc.com/wmsc/upload/file/pdf/v2/lcsc/2304140030_CCTC-TCC1206X7R563K500DT_C282879.pdf; ComponentLink2Description: JLCPCB Part URL; ComponentLink2URL: https://jlcpcb.com/partdetail/C282879; ComponentLink3Description: LCSC Part URL; ComponentLink3URL: https://lcsc.com/product-detail/Multilayer-Ceramic-Capacitors-MLCC---SMD-SMT_CCTC-CCTC-TCC1206X7R563K500DT_C282879.html
footprint CAP-1206 (1206 (3216M) Capacitor)
pins: 1, 2

## TCC1206X7R681K101DT
designator C?  Capacitance: 680pF  (hidden comment: *)
Capacitor, Ceramic (MLCC), 680pF, ±10%, 100V, X7R, ±10%, SMD 1206; Manufacturer: CCTC; Manufacturer Part Number: TCC1206X7R681K101DT; Package Size: 1206; JLCPCB Basic Part: No; JLCPCB Part Number: C344183; Supplier 1: LCSC; Category: Capacitors - MLCC; Supplier Part Number 1: C344183; Tolerance: ±10%; Voltage Rating: 100V; Temperature Coefficient: X7R; RoHS: Yes; ComponentLink1Description: Datasheet; ComponentLink1URL: https://wmsc.lcsc.com/wmsc/upload/file/pdf/v2/lcsc/2304140030_CCTC-TCC1206X7R681K101DT_C344183.pdf; ComponentLink2Description: JLCPCB Part URL; ComponentLink2URL: https://jlcpcb.com/partdetail/C344183; ComponentLink3Description: LCSC Part URL; ComponentLink3URL: https://lcsc.com/product-detail/Multilayer-Ceramic-Capacitors-MLCC---SMD-SMT_CCTC-CCTC-TCC1206X7R681K101DT_C344183.html
footprint CAP-1206 (1206 (3216M) Capacitor)
pins: 1, 2

## TCC1206X7R681K102DTS
designator C?  Capacitance: 680pF  (hidden comment: *)
Capacitor, Ceramic (MLCC), 680pF, ±10%, 1kV, X7R, ±10%, SMD 1206; Manufacturer: CCTC; Manufacturer Part Number: TCC1206X7R681K102DTS; Package Size: 1206; JLCPCB Basic Part: No; JLCPCB Part Number: C344187; Supplier 1: LCSC; Category: Capacitors - MLCC; Supplier Part Number 1: C344187; Tolerance: ±10%; Voltage Rating: 1kV; Temperature Coefficient: X7R; RoHS: Yes; ComponentLink1Description: Datasheet; ComponentLink1URL: https://wmsc.lcsc.com/wmsc/upload/file/pdf/v2/lcsc/2304140030_CCTC-TCC1206X7R681K102DTS_C344187.pdf; ComponentLink2Description: JLCPCB Part URL; ComponentLink2URL: https://jlcpcb.com/partdetail/C344187; ComponentLink3Description: LCSC Part URL; ComponentLink3URL: https://lcsc.com/product-detail/Multilayer-Ceramic-Capacitors-MLCC---SMD-SMT_CCTC-CCTC-TCC1206X7R681K102DTS_C344187.html
footprint CAP-1206 (1206 (3216M) Capacitor)
pins: 1, 2

## TCC1206X7R681K102FT
designator C?  Capacitance: 680pF  (hidden comment: *)
Capacitor, Ceramic (MLCC), 680pF, ±10%, 1kV, X7R, ±10%, SMD 1206; Manufacturer: CCTC; Manufacturer Part Number: TCC1206X7R681K102FT; Package Size: 1206; JLCPCB Basic Part: No; JLCPCB Part Number: C309048; Supplier 1: LCSC; Category: Capacitors - MLCC; Supplier Part Number 1: C309048; Tolerance: ±10%; Voltage Rating: 1kV; Temperature Coefficient: X7R; RoHS: Yes; ComponentLink1Description: Datasheet; ComponentLink1URL: https://wmsc.lcsc.com/wmsc/upload/file/pdf/v2/lcsc/2304140030_CCTC-TCC1206X7R681K102FT_C309048.pdf; ComponentLink2Description: JLCPCB Part URL; ComponentLink2URL: https://jlcpcb.com/partdetail/C309048; ComponentLink3Description: LCSC Part URL; ComponentLink3URL: https://lcsc.com/product-detail/Multilayer-Ceramic-Capacitors-MLCC---SMD-SMT_CCTC-CCTC-TCC1206X7R681K102FT_C309048.html
footprint CAP-1206 (1206 (3216M) Capacitor)
pins: 1, 2

## TCC1206X7R681K500DT
designator C?  Capacitance: 680pF  (hidden comment: *)
Capacitor, Ceramic (MLCC), 680pF, ±10%, 50V, X7R, ±10%, SMD 1206; Manufacturer: CCTC; Manufacturer Part Number: TCC1206X7R681K500DT; Package Size: 1206; JLCPCB Basic Part: No; JLCPCB Part Number: C377114; Supplier 1: LCSC; Category: Capacitors - MLCC; Supplier Part Number 1: C377114; Tolerance: ±10%; Voltage Rating: 50V; Temperature Coefficient: X7R; RoHS: Yes; ComponentLink1Description: Datasheet; ComponentLink1URL: https://wmsc.lcsc.com/wmsc/upload/file/pdf/v2/lcsc/2304140030_CCTC-TCC1206X7R681K500DT_C377114.pdf; ComponentLink2Description: JLCPCB Part URL; ComponentLink2URL: https://jlcpcb.com/partdetail/C377114; ComponentLink3Description: LCSC Part URL; ComponentLink3URL: https://lcsc.com/product-detail/Multilayer-Ceramic-Capacitors-MLCC---SMD-SMT_CCTC-CCTC-TCC1206X7R681K500DT_C377114.html
footprint CAP-1206 (1206 (3216M) Capacitor)
pins: 1, 2
